# Altium footprint library SOP.PcbLib: 19 footprints (part 1 of 2)
Each footprint in its own frame and in the unit in brackets; x right, y up, seen from the top. Pads: shape width x height; smd on the part's side, far side on the other; paste and mask are expansions set on the pad; w line width, h text height; cw(c..) or ccw(c..) is an arc to the next point about the centre after c.
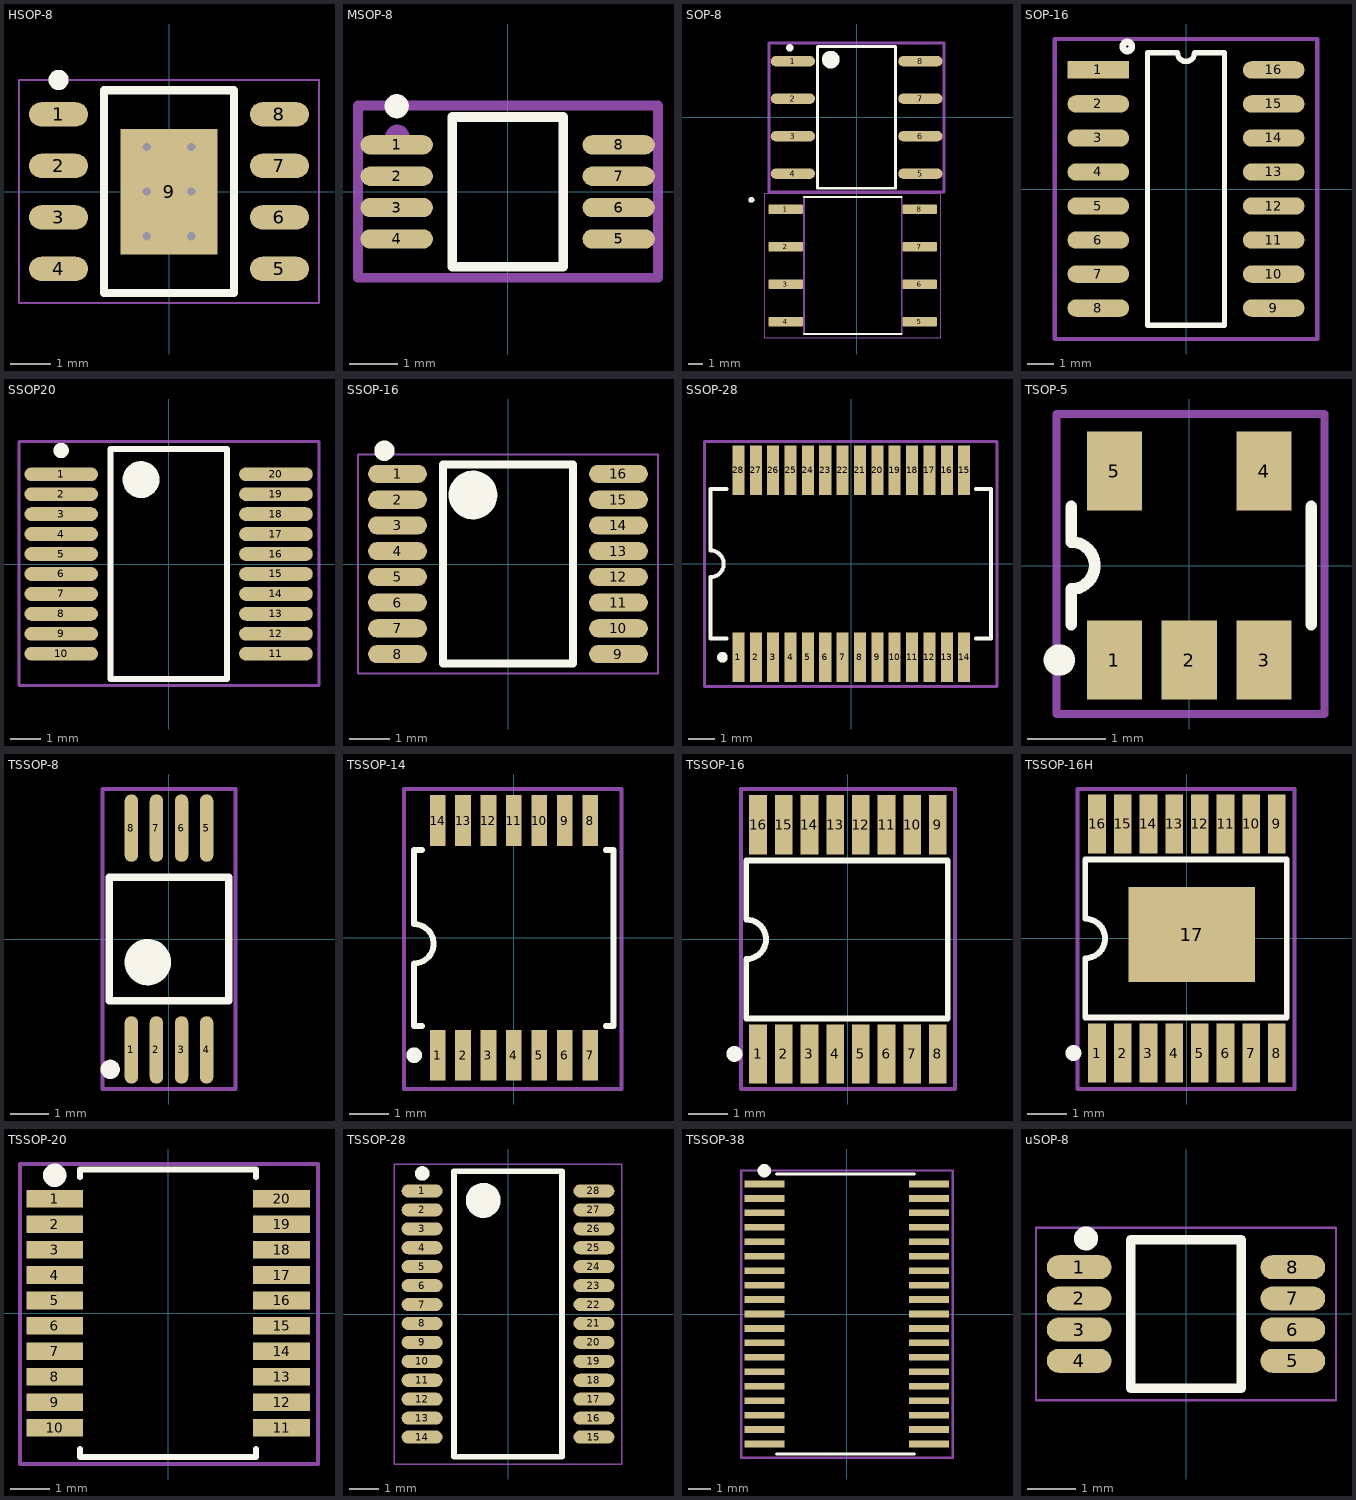
[diagram p0: the footprints below, top view; thin cyan lines are the x and y axes]

## HSOP-8 [mm] "SOP, 8-Leads, Body 4,90x3,90mm, Pitch 1,27mm, Thermal Pad 3,10x2,40mm, IPC Medium Density"
height 1.7
pads (9):
  oval 1.45x0.6 smd: 1(-2.725,1.905) 2(-2.725,0.635) 3(-2.725,-0.635) 4(-2.725,-1.905) 5(2.725,-1.905) 6(2.725,-0.635) 7(2.725,0.635) 8(2.725,1.905)
  rect 2.4x3.1 smd: 9(0,0)
via -0.55,1.1 diameter 0.5 hole 0.2
via 0.55,1.1 diameter 0.5 hole 0.2
via -0.55,0 diameter 0.5 hole 0.2
via 0.55,0 diameter 0.5 hole 0.2
via -0.55,-1.1 diameter 0.5 hole 0.2
via 0.55,-1.1 diameter 0.5 hole 0.2
Top Overlay:
  circle w0.25: c-2.725,2.755 r0.125
  lines w0.2: -1.6,-2.5 -1.6,2.5 1.6,2.5 1.6,-2.5 -1.6,-2.5
Top Assembly:
  circle w0.25: c-2.54,1.905 r0.125
  lines w0.05: -3.7,-2.75 3.7,-2.75 3.7,2.75 -3.7,2.75 -3.7,-2.75
3D body "HSOP8.STEP": height 1.74, standoff -0.01, extent -3.1,-2.587 3.1,2.413

## MSOP-8 [mm] "TSOP, 8-Leads, Body 3,00x3,00mm, Pitch 0,65mm, IPC Medium Density"
height 1.1
pads (8):
  oval 1.5x0.4 smd: 1(-2.3,0.975) 2(-2.3,0.325) 3(-2.3,-0.325) 4(-2.3,-0.975) 5(2.3,-0.975) 6(2.3,-0.325) 7(2.3,0.325) 8(2.3,0.975)
Top Overlay:
  circle w0.25: c-2.3,1.775 r0.125
  lines w0.2: -1.15,-1.55 -1.15,1.55 1.15,1.55 1.15,-1.55 -1.15,-1.55
Top Assembly:
  circle w0.25: c-2.286,1.143 r0.125
  lines w0.2: -3.102,-1.781 -3.102,1.789 3.114,1.789 3.114,-1.781 -0.384,-1.781 -3.102,-1.781
3D body "MSOP-8.step": height 0.92, standoff 0, extent -2.5,-1.5 2.5,1.5

## SOP-8 [mm] "SOP, 8-Leads, Body 9.50x6.62mm, Pitch 2.54mm, IPC Medium Density"
height 4.85
pads (16):
  rrect25% 2.34x0.64 smd: 1(-4.789,-6.223) 2(-4.789,-8.763) 3(-4.789,-11.303) 4(-4.789,-13.843) 5(4.281,-13.843) 6(4.281,-11.303) 7(4.281,-8.763) 8(4.281,-6.223)
  oval 3x0.7 smd: 1(-4.318,3.81) 2(-4.318,1.27) 3(-4.318,-1.27) 4(-4.318,-3.81) 5(4.318,-3.81) 6(4.318,-1.27) 7(4.318,1.27) 8(4.318,3.81)
Top Overlay:
  circle w0.6: c-1.753,3.912 r0.3
  circle w0.25: c-4.525,4.71 r0.125
  circle w0.2: c-7.129,-5.583 r0.1
  lines w0.127: -3.564,-14.676 3.056,-14.676 ; -3.564,-5.39 3.056,-5.39
  lines w0.2: -2.642,-4.8 2.642,-4.8 2.642,4.8 -2.642,4.8 -2.642,-4.8
Top Assembly:
  lines w0.2: -5.925,-5.05 5.925,-5.05 5.925,5.05 -5.925,5.05 -5.925,-5.05
Top 3D Body (Mech13):
  circle w0.2: c-7.129,-5.583 r0.1
  lines w0.127: -3.564,-14.676 -3.564,-5.39 3.056,-5.39 3.056,-14.676 -3.564,-14.676
Bottom 3D Body (Mech15):
  lines w0.05: -6.214,-14.925 -6.214,-5.141 5.706,-5.141 5.706,-14.925 -6.214,-14.925
3D body "sop8-2_54.step": height 2.05, standoff 0, extent -3.498,-4.7 3.302,4.7
3D body "step_temp.STEP": height 4.85, standoff 0, extent -5.454,-14.676 4.946,-5.39

## SOP-16 [mm]
pads (16):
  rect 2.3x0.65 smd: 1(-3.275,4.445)
  oval 2.3x0.65 smd: 2(-3.275,3.175) 3(-3.275,1.905) 4(-3.275,0.635) 5(-3.275,-0.635) 6(-3.275,-1.905) 7(-3.275,-3.175) 8(-3.275,-4.445) 9(3.275,-4.445) 10(3.275,-3.175) 11(3.275,-1.905) 12(3.275,-0.635) 13(3.275,0.635) 14(3.275,1.905) 15(3.275,3.175) 16(3.275,4.445)
Top Overlay:
  lines w0.2: -1.44,-5.08 -1.44,5.08 -0.318,5.08 ccw(c0,5.08) 0.318,5.08 1.44,5.08 1.44,-5.08 -1.44,-5.08
  lines w0.254: -2.029,5.356 ccw(c-2.193,5.32) -2.025,5.32
Top Assembly (Mech8):
  lines w0.152: -4.9,-5.6 4.9,-5.6 4.9,5.6 -4.9,5.6 -4.9,-5.6
3D body "User Library-SOP16_208mil (5_3mm).STEP": height 1.8, standoff -0.2, extent -3.961,-5.1 3.96,5.1

## SSOP20 [mm] "SOP, 20-Leads, Body 7.2x5.3mm, Pitch 0.65mm, IPC Low Density"
height 1.99
pads (20):
  oval 2.4x0.45 smd: 1(-3.5,2.925) 2(-3.5,2.275) 3(-3.5,1.625) 4(-3.5,0.975) 5(-3.5,0.325) 6(-3.5,-0.325) 7(-3.5,-0.975) 8(-3.5,-1.625) 9(-3.5,-2.275) 10(-3.5,-2.925) 11(3.5,-2.925) 12(3.5,-2.275) 13(3.5,-1.625) 14(3.5,-0.975) 15(3.5,-0.325) 16(3.5,0.325) 17(3.5,0.975) 18(3.5,1.625) 19(3.5,2.275) 20(3.5,2.925)
Top Overlay:
  circle w0.25: c-3.5,3.7 r0.125
  circle w0.6: c-0.9,2.75 r0.3
  lines w0.2: -1.9,-3.75 -1.9,3.75 1.9,3.75 1.9,-3.75 -1.9,-3.75
Top Assembly (Mech8):
  lines w0.1: -4.877,-3.962 4.902,-3.962 4.902,3.988 -4.877,3.988 -4.877,-3.962
3D body "SSOP_20.step": height 1.79, standoff -0.05, extent -4.052,-3.617 3.848,3.683

## SSOP-16 [mm] "TSOP, 16-Leads, Body 4,90x3,90mm, Pitch 0,64mm, IPC Medium Density"
height 1.55
pads (16):
  oval 1.45x0.45 smd: 1(-2.725,2.222) 2(-2.725,1.587) 3(-2.725,0.953) 4(-2.725,0.318) 5(-2.725,-0.318) 6(-2.725,-0.953) 7(-2.725,-1.587) 8(-2.725,-2.222) 9(2.725,-2.222) 10(2.725,-1.587) 11(2.725,-0.953) 12(2.725,-0.318) 13(2.725,0.318) 14(2.725,0.953) 15(2.725,1.587) 16(2.725,2.222)
Top Overlay:
  circle w0.6: c-0.864,1.702 r0.3
  circle w0.25: c-3.048,2.794 r0.125
  lines w0.2: -1.6,-2.45 1.6,-2.45 1.6,2.45 -1.6,2.45 -1.6,-2.45
Top Assembly (Mech8):
  lines w0.05: -3.7,-2.7 -3.7,2.7 3.7,2.7 3.7,-2.7 -3.7,-2.7
3D body: height 1.55, standoff 0.05, extent -2,-2.45 2,2.45

## SSOP-28 [mm]
pads (28):
  rect 0.45x1.85 smd mask+0.05: 1(-4.225,-3.5) 2(-3.575,-3.5) 3(-2.925,-3.5) 4(-2.275,-3.5) 5(-1.625,-3.5) 6(-0.975,-3.5) 7(-0.325,-3.5) 8(0.325,-3.5) 9(0.975,-3.5) 10(1.625,-3.5) 11(2.275,-3.5) 12(2.925,-3.5) 13(3.575,-3.5) 14(4.225,-3.5) 15(4.225,3.5) 16(3.575,3.5) 17(2.925,3.5) 18(2.275,3.5) 19(1.625,3.5) 20(0.975,3.5) 21(0.325,3.5) 22(-0.325,3.5) 23(-0.975,3.5) 24(-1.625,3.5) 25(-2.275,3.5) 26(-2.925,3.5) 27(-3.575,3.5) 28(-4.225,3.5)
Top Overlay:
  circle w0.2: c-4.825,-3.5 r0.1
  lines w0.15: -4.675,-2.8 -5.275,-2.8 -5.275,-0.5 ccw(c-5.275,0) -5.275,0.5 -5.275,2.8 -4.675,2.8 ; 4.675,-2.8 5.225,-2.8 5.225,2.8 4.675,2.8
Top Assembly (Mech8):
  lines w0.1: -5.495,-4.592 5.452,-4.592 5.452,4.577 -5.495,4.577 -5.495,-4.592
3D body "SSOP-28.step": height 2.15, standoff 0, extent -5.199,-3.949 5.131,3.807

## TSOP-5 [mm]
pads (5):
  rect 0.7x1 smd mask+0.05: 1(-0.95,-1.2) 2(0,-1.2) 3(0.95,-1.2) 4(0.95,1.2) 5(-0.95,1.2)
Top Overlay:
  circle w0.2: c-1.65,-1.2 r0.1
  lines w0.15: -1.5,-0.75 -1.5,-0.3 ccw(c-1.5,0) -1.5,0.3 -1.5,0.75 ; 1.55,-0.75 1.55,0.75
Top Assembly (Mech8):
  lines w0.1: -1.687,-1.886 1.717,-1.886 1.717,1.924 -1.687,1.924 -1.687,-1.886
3D body "User Library-5-TSOP.sldprt": height 1.1, standoff 0, extent -1.535,-1.506 1.565,1.494

## TSSOP-8 [mm] "TSOP, 8-Leads, Body 3,1x4,5mm (max), Pitch 0,65mm, IPC Medium Density"
height 1.2
pads (8):
  oval 0.35x1.75 smd: 1(-0.975,-2.875) 2(-0.325,-2.875) 3(0.325,-2.875) 4(0.975,-2.875) 5(0.975,2.875) 6(0.325,2.875) 7(-0.325,2.875) 8(-0.975,2.875)
Top Overlay:
  circle w0.6: c-0.55,-0.6 r0.3
  circle w0.25: c-1.524,-3.378 r0.125
  lines w0.2: -1.55,-1.6 -1.55,1.6 1.55,1.6 1.55,-1.6 -1.55,-1.6
Top Assembly (Mech8):
  lines w0.1: -1.727,-3.886 1.727,-3.886 1.727,3.886 -1.727,3.886 -1.727,-3.886
3D body "User Library-TSS0P8-1.step": height 1.09, standoff 0, extent -1.501,-3.089 1.499,3.191

## TSSOP-14 [mm]
pads (14):
  rect 0.4x1.3 smd mask+0.05: 1(-1.95,-3) 2(-1.3,-3) 3(-0.65,-3) 4(0,-3) 5(0.65,-3) 6(1.3,-3) 7(1.95,-3) 8(1.95,3) 9(1.3,3) 10(0.65,3) 11(0,3) 12(-0.65,3) 13(-1.3,3) 14(-1.95,3)
Top Overlay:
  circle w0.2: c-2.55,-3 r0.1
  lines w0.15: -2.35,-2.25 -2.55,-2.25 -2.55,-0.65 ccw(c-2.55,-0.15) -2.55,0.35 -2.55,2.25 -2.35,2.25 ; 2.35,-2.25 2.55,-2.25 2.55,2.25 2.35,2.25
Top Assembly (Mech8):
  lines w0.1: -2.814,-3.864 2.749,-3.864 2.749,3.807 -2.814,3.807 -2.814,-3.864
3D body "User Library-tssop14-2.sldprt": height 1.2, standoff 0, extent -2.55,-3.177 2.55,3.223

## TSSOP-16 [mm]
pads (16):
  rect 0.45x1.5 smd mask+0.05: 1(-2.275,-2.9) 2(-1.625,-2.9) 3(-0.975,-2.9) 4(-0.325,-2.9) 5(0.325,-2.9) 6(0.975,-2.9) 7(1.625,-2.9) 8(2.275,-2.9) 9(2.275,2.9) 10(1.625,2.9) 11(0.975,2.9) 12(0.325,2.9) 13(-0.325,2.9) 14(-0.975,2.9) 15(-1.625,2.9) 16(-2.275,2.9)
Top Overlay:
  circle w0.2: c-2.875,-2.9 r0.1
  lines w0.15: -2.575,-2 2.525,-2 2.525,2 -2.575,2 -2.575,0.5 cw(c-2.575,0) -2.575,-0.5 -2.575,-2
Top Assembly (Mech8):
  lines w0.1: -2.707,-3.789 -2.707,3.806 2.703,3.806 2.703,-3.789 -2.707,-3.789
3D body "TSSOP-16.step": height 1, standoff 0, extent -2.489,-3.179 2.511,3.221

## TSSOP-16H [mm]
pads (17):
  rect 0.45x1.5 smd mask+0.05: 1(-2.275,-2.9) 2(-1.625,-2.9) 3(-0.975,-2.9) 4(-0.325,-2.9) 5(0.325,-2.9) 6(0.975,-2.9) 7(1.625,-2.9) 8(2.275,-2.9) 9(2.275,2.9) 10(1.625,2.9) 11(0.975,2.9) 12(0.325,2.9) 13(-0.325,2.9) 14(-0.975,2.9) 15(-1.625,2.9) 16(-2.275,2.9)
  rect 3.2x2.4 smd: 17(0.125,0.1)
Top Overlay:
  circle w0.2: c-2.875,-2.9 r0.1
  lines w0.15: -2.575,-2 -2.575,-0.5 ccw(c-2.575,0) -2.575,0.5 -2.575,2 2.525,2 2.525,-2 -2.575,-2
Top Assembly (Mech8):
  lines w0.1: -2.769,-3.81 -2.769,3.785 2.718,3.785 2.718,-3.81 -2.769,-3.81
3D body "TSSOP-16.step": height 1, standoff 0, extent -2.489,-3.179 2.511,3.221

## TSSOP-20 [mm]
pads (20):
  rect 1.45x0.45 smd mask+0.05: 1(-2.9,2.925) 2(-2.9,2.275) 3(-2.9,1.625) 4(-2.9,0.975) 5(-2.9,0.325) 6(-2.9,-0.325) 7(-2.9,-0.975) 8(-2.9,-1.625) 9(-2.9,-2.275) 10(-2.9,-2.925) 11(2.9,-2.925) 12(2.9,-2.275) 13(2.9,-1.625) 14(2.9,-0.975) 15(2.9,-0.325) 16(2.9,0.325) 17(2.9,0.975) 18(2.9,1.625) 19(2.9,2.275) 20(2.9,2.925)
Top Overlay:
  circle w0.3: c-2.9,3.525 r0.15
  lines w0.15: -2.25,-3.475 -2.25,-3.675 2.25,-3.675 2.25,-3.475 ; -2.25,3.475 -2.25,3.675 2.25,3.675 2.25,3.475
Top Assembly (Mech8):
  lines w0.1: -3.789,-3.857 -3.789,3.814 3.831,3.814 3.831,-3.857 -3.789,-3.857
3D body "User Library-tssop-20-1.sldprt": height 1.2, standoff 0, extent -3.3,-3.275 3.3,3.325

## TSSOP-28 [mm] "TSOP, 28-Leads, Body 9,70x4,40mm, Pitch 0,65mm, IPC Medium Density"
height 1.2
pads (28):
  oval 1.4x0.45 smd: 1(-2.95,4.225) 2(-2.95,3.575) 3(-2.95,2.925) 4(-2.95,2.275) 5(-2.95,1.625) 6(-2.95,0.975) 7(-2.95,0.325) 8(-2.95,-0.325) 9(-2.95,-0.975) 10(-2.95,-1.625) 11(-2.95,-2.275) 12(-2.95,-2.925) 13(-2.95,-3.575) 14(-2.95,-4.225) 15(2.95,-4.225) 16(2.95,-3.575) 17(2.95,-2.925) 18(2.95,-2.275) 19(2.95,-1.625) 20(2.95,-0.975) 21(2.95,-0.325) 22(2.95,0.325) 23(2.95,0.975) 24(2.95,1.625) 25(2.95,2.275) 26(2.95,2.925) 27(2.95,3.575) 28(2.95,4.225)
Top Overlay:
  circle w0.6: c-0.85,3.9 r0.3
  circle w0.25: c-2.946,4.826 r0.125
  lines w0.2: -1.85,-4.9 1.85,-4.9 1.85,4.9 -1.85,4.9 -1.85,-4.9
Top Assembly (Mech8):
  lines w0.05: -3.9,-5.15 -3.9,5.15 3.9,5.15 3.9,-5.15 -3.9,-5.15
3D body "User Library-TSSOP-28_P065.STEP": height 1.02, standoff 0.03, extent -3.2,-4.85 3.2,4.85

## TSSOP-38 [mm]
pads (38):
  rect 1.8x0.3 smd mask+0.07: 1(-3.7,5.85) 2(-3.7,5.2) 3(-3.7,4.55) 4(-3.7,3.9) 5(-3.7,3.25) 6(-3.7,2.6) 7(-3.7,1.95) 8(-3.7,1.3) 9(-3.7,0.65) 10(-3.7,0) 11(-3.7,-0.65) 12(-3.7,-1.3) 13(-3.7,-1.95) 14(-3.7,-2.6) 15(-3.7,-3.25) 16(-3.7,-3.9) 17(-3.7,-4.55) 18(-3.7,-5.2) 19(-3.7,-5.85) 20(3.7,-5.85) 21(3.7,-5.2) 22(3.7,-4.55) 23(3.7,-3.9) 24(3.7,-3.25) 25(3.7,-2.6) 26(3.7,-1.95) 27(3.7,-1.3) 28(3.7,-0.65) 29(3.7,0) 30(3.7,0.65) 31(3.7,1.3) 32(3.7,1.95) 33(3.7,2.6) 34(3.7,3.25) 35(3.7,3.9) 36(3.7,4.55) 37(3.7,5.2) 38(3.7,5.85)
Top Overlay:
  circle w0.3: c-3.7,6.45 r0.15
  lines w0.15: -3.15,-6.3 3.05,-6.3 ; -3.15,6.3 3.05,6.3
Top Assembly (Mech8):
  lines w0.1: -4.741,-6.469 4.784,-6.469 4.784,6.46 -4.741,6.46 -4.741,-6.469
3D body "User Library-TSSOP-38 12_6x6_2.STEP": height 1.2, standoff 0.1, extent -4.05,-6.3 4.05,6.3

## uSOP-8 [mm] "TSOP, 8-Leads, Body 3,00x3,00mm, Pitch 0,65mm, IPC Medium Density"
height 1.1
pads (8):
  oval 1.35x0.5 smd: 1(-2.225,0.975) 2(-2.225,0.325) 3(-2.225,-0.325) 4(-2.225,-0.975) 5(2.225,-0.975) 6(2.225,-0.325) 7(2.225,0.325) 8(2.225,0.975)
Top Overlay:
  circle w0.25: c-2.083,1.575 r0.125
  lines w0.2: -1.15,-1.55 1.15,-1.55 1.15,1.55 -1.15,1.55 -1.15,-1.55
Top Assembly (Mech8):
  lines w0.05: -3.125,-1.8 -3.125,1.8 3.125,1.8 3.125,-1.8 -3.125,-1.8
3D body "uSOP8.step": height 1.1, standoff 0, extent -2.515,-1.576 2.515,1.524